# Altium footprint library swatpcblib.PcbLib: 202 footprints (part 2 of 13)
Each footprint in its own frame and in the unit in brackets; x right, y up, seen from the top. Pads: shape width x height; smd on the part's side, far side on the other; paste and mask are expansions set on the pad; w line width, h text height; cw(c..) or ccw(c..) is an arc to the next point about the centre after c.
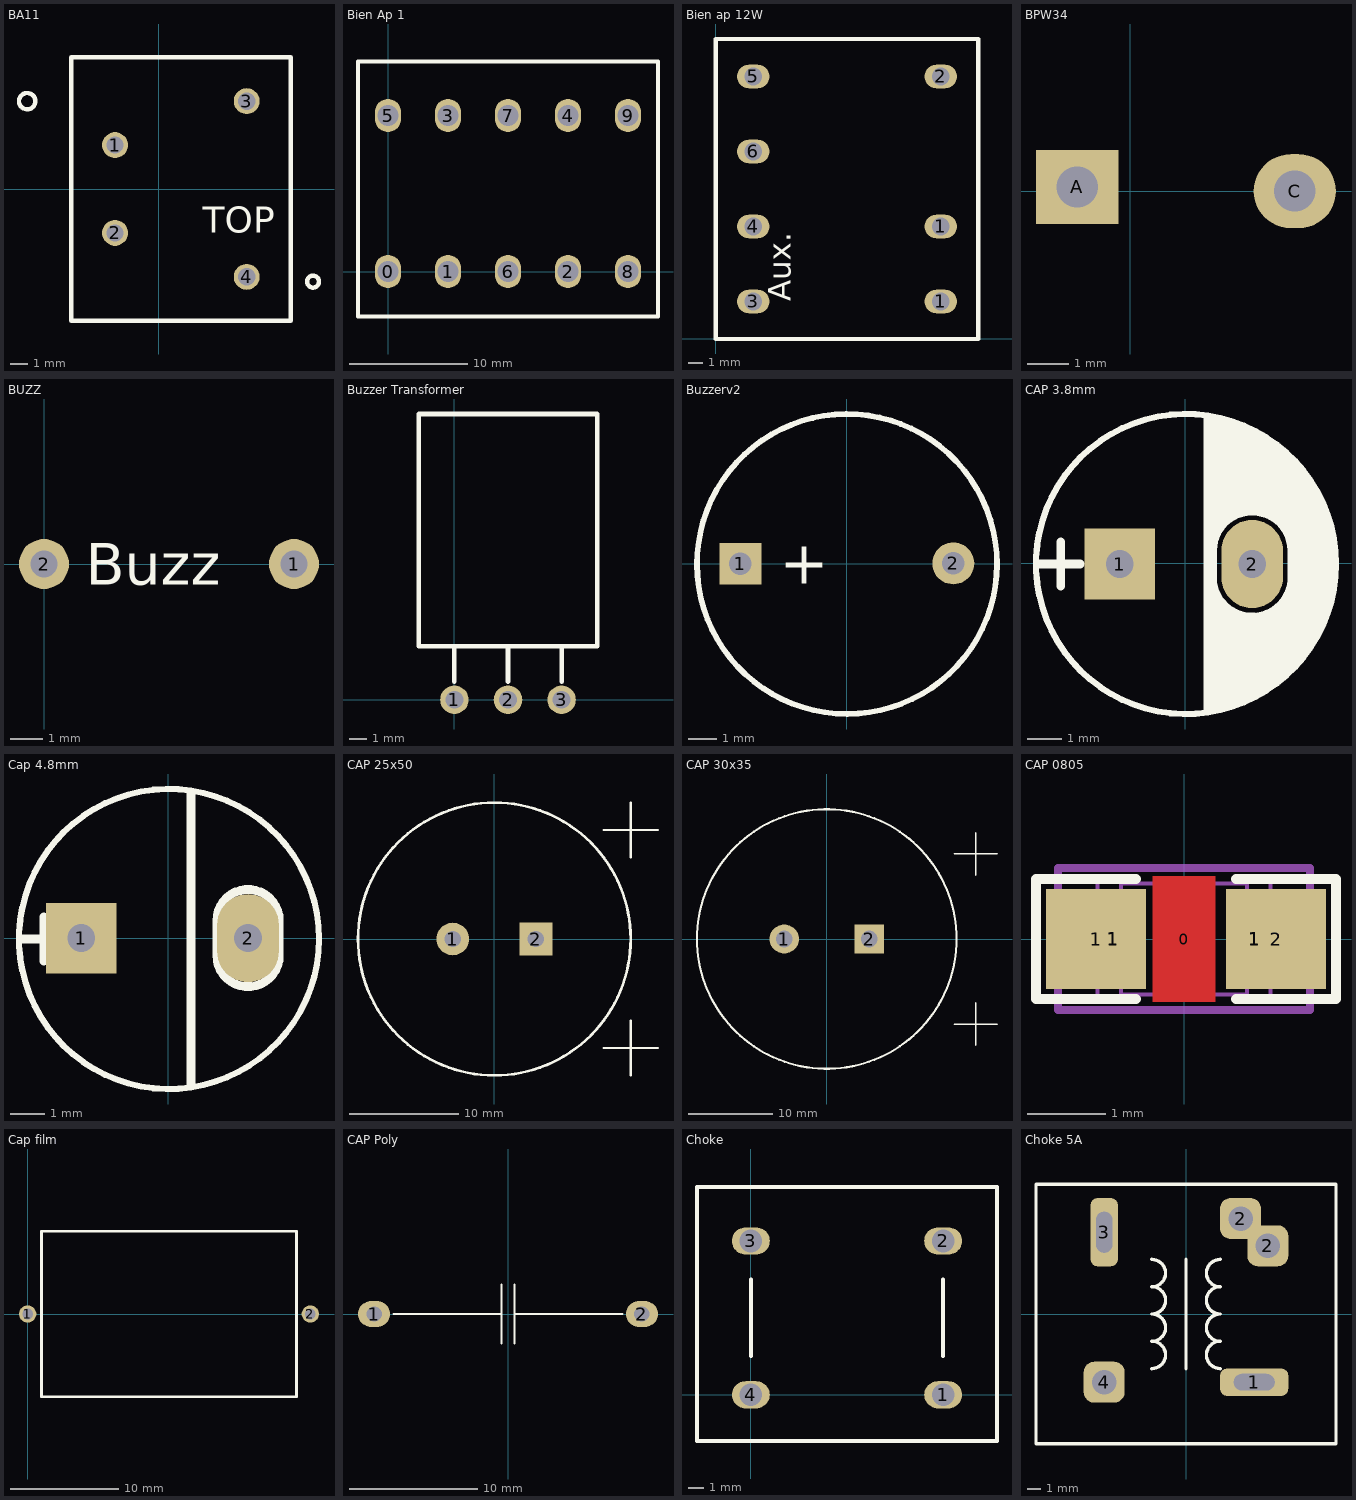
[diagram p1: the footprints below, top view; thin cyan lines are the x and y axes]

## BA11 [mm]
pads (4):
  round 1.5 hole 1: 1(-2.54,2.54) 2(-2.54,-2.54) 3(5.08,5.08) 4(5.08,-5.08)
Top Overlay:
  circle w0.254: c-7.62,5.08 r0.475
  circle w0.254: c8.915,-5.359 r0.345
  lines w0.254: -5.08,-7.62 7.62,-7.62 7.62,7.62 -5.08,7.62 -5.08,-7.62
  text "TOP" at 2.54,-2.54 h1.52
Bottom Overlay:
  text "BOT" at 2.515,-2.642 h1.52
3D body "User Library-UU16.step": height 29.35, standoff 0, extent -10.804,-9.35 11.43,9.35

## Bien Ap 1 [mm]
pads (10):
  oval 2.2x2.8 hole 1.8: 0(0,0) 1(5.08,0) 2(15.24,0) 3(5.08,13.208) 4(15.24,13.208) 5(0,13.208) 6(10.16,0) 7(10.16,13.208) 8(20.32,0) 9(20.32,13.208)
Top Overlay:
  lines w0.3: -2.54,-3.81 -2.54,17.78 22.86,17.78 22.86,-3.81 -2.54,-3.81

## Bien ap 12W [mm]
pads (7):
  oval 2.2x1.6 hole 1.2: 1(15.24,2.54) 1(15.24,7.62) 2(15.24,17.78) 3(2.54,2.54) 4(2.54,7.62) 5(2.54,17.78) 6(2.54,12.7)
Top Overlay:
  lines w0.3: 0,0 17.78,0 17.78,20.32 0,20.32 0,0
  text ".Pri" at 5.08,12.7 h1.52
  text "Aux." at 5.08,2.54 h1.52
  text ".Sec" at 15.24,10.16 h1.52
3D body "User Library-Phone Line Transformer.STEP": height 16, standoff -3, extent 0.14,0.16 17.64,20.16

## BPW34 [mm]
pads (2):
  rect 2x1.8 hole 1: A(-1.285,0.103)
  oval 2x1.8 hole 1: C(4,0)
3D body "bpw34-1.X_T": height 3.09, standoff -2.11, extent -1.285,-2.097 4.115,2.303

## BUZZ [mil]
pads (2):
  round 60 hole 32: 1(300,0) 2(0,0)
Top Overlay:
  text "Buzz" at 50,-25 h50

## Buzzer Transformer [mm]
pads (3):
  round 1.6 hole 1: 1(0,0) 2(3,0) 3(6,0)
Top Overlay:
  lines w0.254: 0,1 0,3 ; 3,1 3,3 ; 6,1 6,3 ; -2,3 8,3 8,16 -2,16 -2,3
3D body: height 10, standoff 0, extent -2,3 8,16

## Buzzerv2 [mm]
pads (2):
  rect 1.5x1.5 hole 0.8: 1(-3.81,0)
  round 1.5 hole 0.8: 2(3.81,0.013)
Top Overlay:
  lines w0.203: 3.914,3.67 ccw(c0.006,-0.008) 3.95,3.632
  text "+" at -2.4,-0.711 h1.52
3D body "User Library-Buzzer WST-1203UX.step": height 4.5, standoff -9.65, extent -6.025,-6 9.429,6

## CAP 3.8mm [mil] "16V 470uF"
height 787.4
pads (2):
  rect 80x80 hole 31.5: 1(-74,-1)
  oval 70x100 hole 31.5: 2(76,-1)
Top Overlay:
  circle w7: c1,-1 r170
  region: 26,24 61,59 88.93,59 90.6,58.92 93.88,58.26 96.98,56.98 99.76,55.12 101,54 107.46,47.54 108.26,46.66 109.57,44.69 110.48,42.5 110.94,40.18 111,39 116,34 117.12,32.76 118.98,29.98 120.26,26.88 120.92,23.6 121,21.93 121,-28.93 120.92,-30.6 120.26,-33.88 118.98,-36.98 117.12,-39.76 116,-41 104.54,-52.46 103.66,-53.26 101.69,-54.57 99.5,-55.48 97.18,-55.94 96,-56 94.76,-57.12 91.98,-58.98 88.88,-60.26 85.6,-60.92 83.93,-61 70.14,-61 66.8,-60.84 60.23,-59.53 54.05,-56.97 48.48,-53.25 46,-51 34.54,-39.54 33.74,-38.66 32.43,-36.69 31.52,-34.5 31.06,-32.18 31,-31 26,-31 26,-171 81,-151 121,-121 151,-81 171,-21 171,19 156,69 126,114 91,144 46,164 26,169
  lines w10: -164,-1 -119,-1 ; -141,-26 -141,24 ; 26,-166 26,164 ; 26,24 31,24 ; 31,-21 31,29 ; 31,-11 ccw(c76,-16) 71,-61 ccw(c76,-16) 121,-21 121,14 ccw(c76,14) 76,59 ccw(c76,14) 31,14
3D body "User Library-CAP 8X11_5.STEP": height 445.89, standoff -754.41, extent -158.96,-158.48 156,156.48

## Cap 4.8mm [mm] "25V 1000uF 4.8mm/10x20mm"
height 20
pads (2):
  rect 2.032x2.032 hole 0.8: 1(-2.5,0)
  oval 1.778x2.54 hole 0.8: 2(2.3,0)
Top Overlay:
  circle w0.178: c0.025,-0.025 r4.318
  lines w0.254: -4.166,-0.025 -3.023,-0.025 ; -3.581,-0.66 -3.581,0.61 ; 0.66,-4.216 0.66,4.166 ; 1.4,-0.5 ccw(c2.3,-0.5) 3.2,-0.5 3.2,0.5 ccw(c2.3,0.5) 1.4,0.5 1.4,-0.5
3D body "User Library-CAP 8X11_5.STEP": height 11.33, standoff -19.16, extent -4.038,-4.025 3.962,3.975

## CAP 25x50 [mm]
pads (2):
  round 3 hole 1.5: 1(-3.81,0)
  rect 3x3 hole 1.5: 2(3.81,0)
Top Overlay:
  circle w0.254: c0,0 r12.5
  lines w0.203: 10,-10 15,-10 ; 10,10 15,10 ; 12.5,-12.5 12.5,-7.5 ; 12.5,7.5 12.5,12.5
3D body "User Library-Cap 25x50.STEP": height 50.01, standoff -18.99, extent -12.5,-12.5 12.5,12.5

## CAP 30x35 [mm]
pads (2):
  round 3.5 hole 2: 1(-5.08,0)
  rect 3.5x3.5 hole 2: 2(5.08,0)
Top Overlay:
  circle w0.254: c0,0 r15.494
  lines w0.203: 15.24,-10.16 20.32,-10.16 ; 15.24,10.16 20.32,10.16 ; 17.78,-12.7 17.78,-7.62 ; 17.78,7.62 17.78,12.7
3D body "User Library-Assy_CE_R400_D1200_H1450.STEP": height 37.83, standoff -5.89, extent -15.24,-15.367 15.24,15.113

## CAP 0805 [mm]
pads (7):
  round 0.254 on Mech14: 0(0,0)
  rect 1.27x1.27 smd: 1(-1.118,0) 2(1.168,0)
  rrect25% 1x1.4 on Top Paste: 1(-0.9,0) 1(0.9,0)
  rrect25% 1.2x1.4 on Top Solder: 1(-0.9,0) 1(0.9,0)
Top Layer:
  pour cut-out: 0.4,-0.8 -0.4,-0.8 -0.4,0.8 0.4,0.8
Top Overlay:
  lines w0.127: -0.61,-0.762 -1.88,-0.762 -1.88,0.762 -0.61,0.762 ; 0.66,-0.762 1.93,-0.762 1.93,0.762 0.66,0.762
Mechanical 13:
  lines w0.05: -0.8,-0.705 0.8,-0.705 ; -0.8,0.705 0.8,0.705 ; -1.1,-0.725 -0.8,-0.725 -0.8,0.725 -1.1,0.725 -1.1,-0.725 ; 0.8,-0.725 0.8,0.725 1.1,0.725 1.1,-0.725 0.8,-0.725
Mechanical 14:
  lines w0.1: -1.6,-0.9 -1.6,0.9 1.6,0.9 1.6,-0.9 -1.6,-0.9
3D body "CAP_0805.STEP": height 1.34, standoff -0.01, extent -1.1,-0.725 1.1,0.725

## Cap film [mm]
pads (2):
  round 1.6 hole 1: 1(0,0) 2(26.035,0)
Top Overlay:
  lines w0.254: 1.27,-7.62 24.765,-7.62 24.765,7.62 1.27,7.62 1.27,-7.62
3D body: height 10, standoff 1, extent 1.27,-7.62 24.765,7.62

## CAP Poly [mm]
pads (2):
  oval 2.5x2 hole 1.2: 1(-10.414,0) 2(10.414,0)
Top Overlay:
  lines w0.15: -8.89,0 -0.508,0 ; -0.508,-2.286 -0.508,2.286 ; 0.508,-2.286 0.508,2.286 ; 0.508,0 8.89,0
3D body "User Library-cap-21.step": height 14, standoff -3, extent -11,-2.5 11,2.5

## Choke [mm] "Choke"
pads (4):
  oval 2.5x1.8 hole 1.5: 1(12.7,0) 2(12.7,10.16) 3(0,10.16) 4(0,0)
Top Overlay:
  lines w0.254: 0,2.54 0,7.62 ; 12.7,2.54 12.7,7.62 ; -3.556,-3.048 16.256,-3.048 16.256,13.716 -3.556,13.716 -3.556,-3.048
3D body "Coilcraft-BU10.STEP": height 22.5, standoff -4.5, extent -3.065,-2.921 15.875,13.179

## Choke 5A [mm]
pads (5):
  rrect50% 5x2 hole 1.2 slot 3 at 0 deg: 1(5,-5)
  rrect50% 3x3 hole 1.8: 2(4,7) 2(6,5) 4(-6,-5)
  rrect50% 2x5 hole 3 slot 1.2 at 0 deg: 3(-6,6)
Top Overlay:
  lines w0.254: -2.5,-4 ccw(c-2.5,-3) -2.5,-2 ccw(c-2.5,-1) -2.5,0 ccw(c-2.5,1) -2.5,2 ccw(c-2.5,3) -2.5,4 ; 0,-4 0,4 ; 2.5,-4 cw(c2.5,-3) 2.5,-2 cw(c2.5,-1) 2.5,0 cw(c2.5,1) 2.5,2 cw(c2.5,3) 2.5,4 ; -11,-9.5 11,-9.5 11,9.5 -11,9.5 -11,-9.5
3D body "User Library-UU16.step": height 25.56, standoff -3.79, extent -11.112,-9.375 11.122,9.325